# Altium footprint library PcbLib1.PcbLib: 150 footprints (part 4 of 10)
Each footprint in its own frame and in the unit in brackets; x right, y up, seen from the top. Pads: shape width x height; smd on the part's side, far side on the other; paste and mask are expansions set on the pad; w line width, h text height; cw(c..) or ccw(c..) is an arc to the next point about the centre after c.
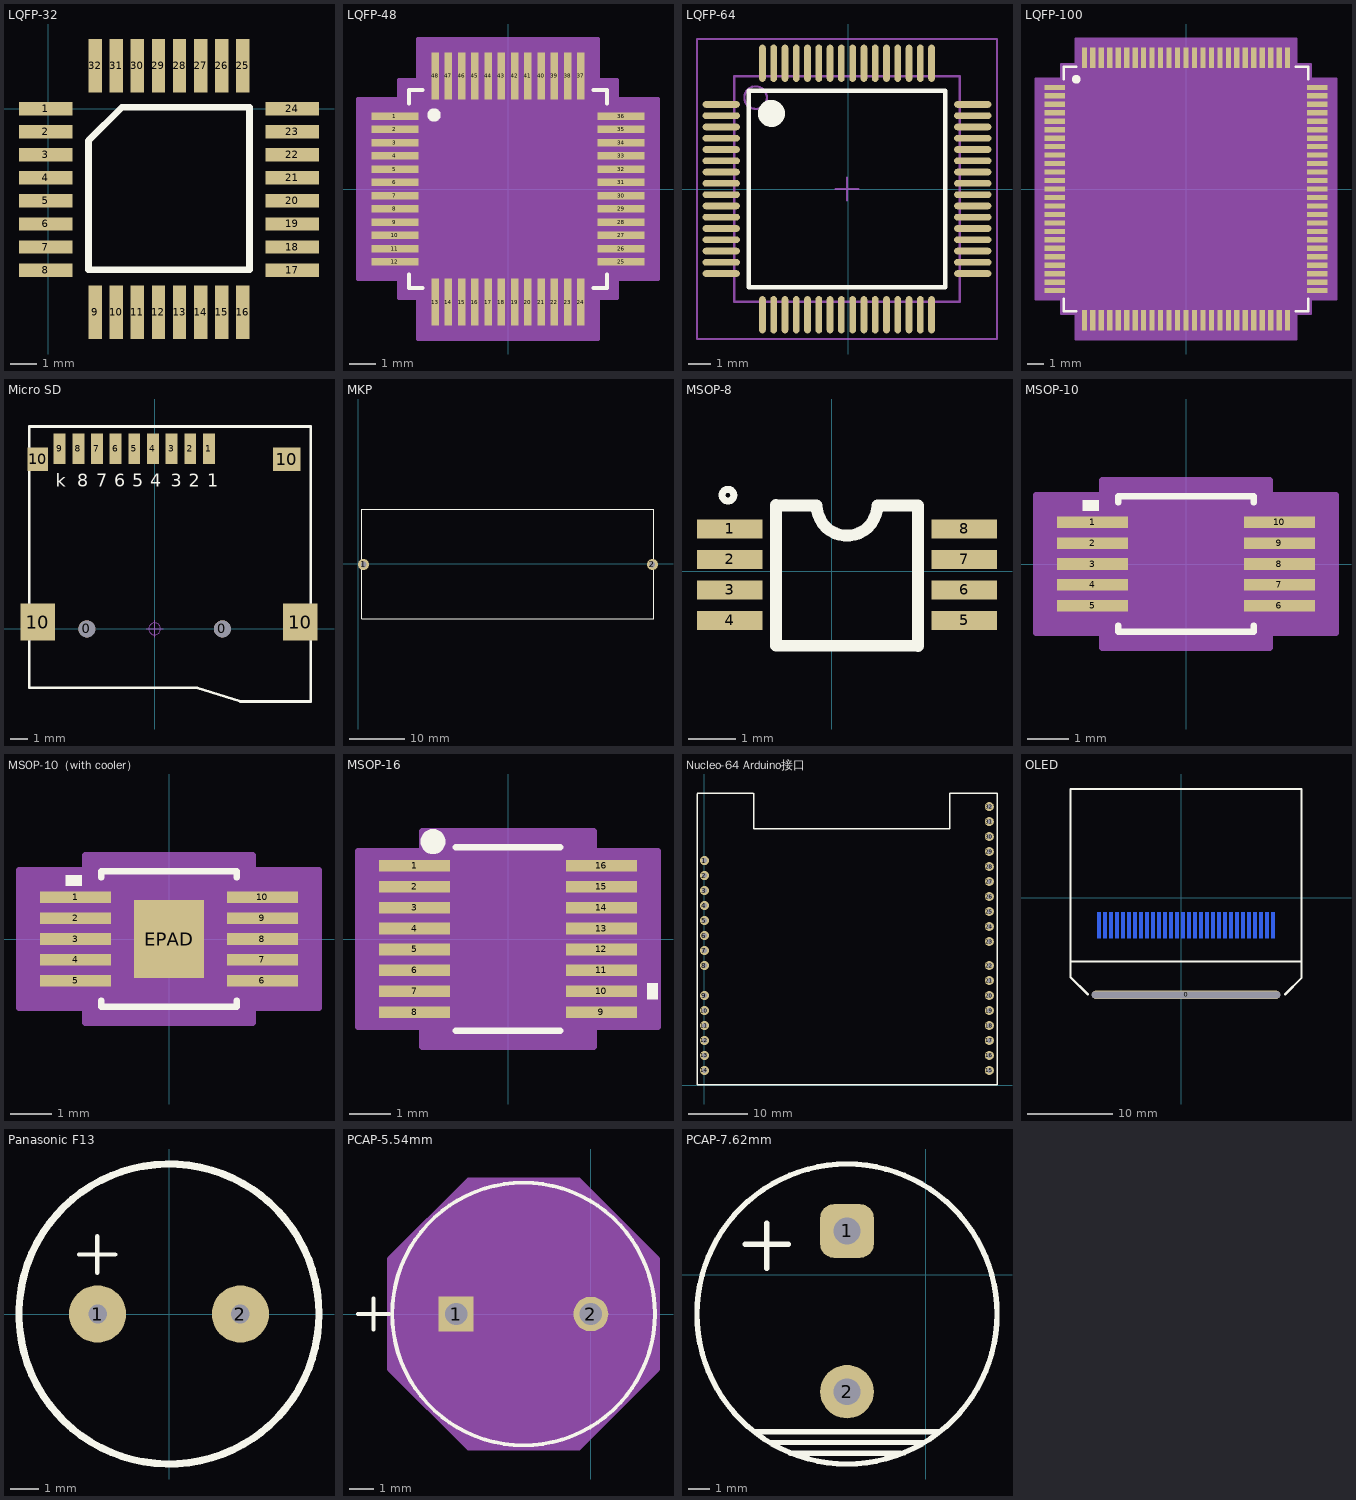
[diagram p3: the footprints below, top view; thin cyan lines are the x and y axes]

## LQFP-32 [mil]
pads (32):
  rect 80x20 smd: 1(-4,0) 2(-4,-34.5) 3(-4,-68.99) 4(-4,-103.49) 5(-4,-137.98) 6(-4,-172.48) 7(-4,-206.98) 8(-4,-241.47) 17(364.47,-241.47) 18(364.47,-206.98) 19(364.47,-172.48) 20(364.47,-137.98) 21(364.47,-103.49) 22(364.47,-68.99) 23(364.47,-34.5) 24(364.47,0)
  rect 20x80 smd: 9(70,-304.47) 10(101.5,-304.47) 11(132.99,-304.47) 12(164.49,-304.47) 13(195.98,-304.47) 14(227.48,-304.47) 15(258.98,-304.47) 16(290.47,-304.47) 25(290.47,64) 26(258.98,64) 27(227.48,64) 28(195.98,64) 29(164.49,64) 30(132.99,64) 31(101.5,64) 32(70,64)
Top Overlay:
  lines w10: 60,-241 60,-48 110,2 300.47,2 300.47,-241 60,-241

## LQFP-48 [mil]
pads (48):
  rect 70x11 smd paste+0 mask+0: 1(-168,108.27) 2(-168,88.58) 3(-168,68.9) 4(-168,49.21) 5(-168,29.53) 6(-168,9.84) 7(-168,-9.84) 8(-168,-29.53) 9(-168,-49.21) 10(-168,-68.9) 11(-168,-88.58) 12(-168,-108.27) 25(168,-108.27) 26(168,-88.58) 27(168,-68.9) 28(168,-49.21) 29(168,-29.53) 30(168,-9.84) 31(168,9.84) 32(168,29.53) 33(168,49.21) 34(168,68.9) 35(168,88.58) 36(168,108.27)
  rect 11x70 smd paste+0 mask+0: 13(-108.27,-168) 14(-88.58,-168) 15(-68.9,-168) 16(-49.21,-168) 17(-29.53,-168) 18(-9.84,-168) 19(9.84,-168) 20(29.53,-168) 21(49.21,-168) 22(68.9,-168) 23(88.58,-168) 24(108.27,-168) 37(108.27,168) 38(88.58,168) 39(68.9,168) 40(49.21,168) 41(29.53,168) 42(9.84,168) 43(-9.84,168) 44(-29.53,168) 45(-49.21,168) 46(-68.9,168) 47(-88.58,168) 48(-108.27,168)
Top Overlay:
  circle w10: c-110,110 r5
  lines w6: -147,-126.87 -147,-147 -126.87,-147 ; -147,126.87 -147,147 -126.87,147 ; 126.87,-147 147,-147 147,-126.87 ; 126.87,147 147,147 147,126.87
Mechanical 15:
  region: -133.77,-162 -162,-162 -162,-133.77 -223,-133.77 -223,133.77 -162,133.77 -162,162 -133.77,162 -133.77,223 133.77,223 133.77,162 162,162 162,133.77 223,133.77 223,-133.77 162,-133.77 162,-162 133.77,-162 133.77,-223 -133.77,-223
  lines w6: -223,-133.77 -223,133.77 -162,133.77 -162,162 -133.77,162 -133.77,223 133.77,223 133.77,162 162,162 162,133.77 223,133.77 223,-133.77 162,-133.77 162,-162 133.77,-162 133.77,-223 -133.77,-223 -133.77,-162 -162,-162 -162,-133.77 -223,-133.77
3D body "LQFP-48-M.stp": height 63.1, standoff 0, extent -181,-181 181,181

## LQFP-64 [mm]
pads (64):
  oval 1.65x0.3 smd: 1(-5.626,3.75) 2(-5.626,3.25) 3(-5.626,2.75) 4(-5.626,2.25) 5(-5.626,1.75) 6(-5.626,1.25) 7(-5.626,0.75) 8(-5.626,0.25) 9(-5.626,-0.25) 10(-5.626,-0.75) 11(-5.626,-1.25) 12(-5.626,-1.75) 13(-5.626,-2.25) 14(-5.626,-2.75) 15(-5.626,-3.25) 16(-5.626,-3.75) 33(5.524,-3.75) 34(5.524,-3.25) 35(5.524,-2.75) 36(5.524,-2.25) 37(5.524,-1.75) 38(5.524,-1.25) 39(5.524,-0.75) 40(5.524,-0.25) 41(5.524,0.25) 42(5.524,0.75) 43(5.524,1.25) 44(5.524,1.75) 45(5.524,2.25) 46(5.524,2.75) 47(5.524,3.25) 48(5.524,3.75)
  oval 0.3x1.65 smd: 17(-3.801,-5.575) 18(-3.301,-5.575) 19(-2.801,-5.575) 20(-2.301,-5.575) 21(-1.801,-5.575) 22(-1.301,-5.575) 23(-0.801,-5.575) 24(-0.301,-5.575) 25(0.199,-5.575) 26(0.699,-5.575) 27(1.199,-5.575) 28(1.699,-5.575) 29(2.199,-5.575) 30(2.699,-5.575) 31(3.199,-5.575) 32(3.699,-5.575) 49(3.699,5.575) 50(3.199,5.575) 51(2.699,5.575) 52(2.199,5.575) 53(1.699,5.575) 54(1.199,5.575) 55(0.699,5.575) 56(0.199,5.575) 57(-0.301,5.575) 58(-0.801,5.575) 59(-1.301,5.575) 60(-1.801,5.575) 61(-2.301,5.575) 62(-2.801,5.575) 63(-3.301,5.575) 64(-3.801,5.575)
Top Overlay:
  circle w0.6: c-3.401,3.35 r0.3
  lines w0.2: -4.401,-4.35 4.299,-4.35 4.299,4.35 -4.401,4.35 -4.401,-4.35
Mechanical 13:
  circle w0.1: c-4.101,4.05 r0.5
  lines w0.1: -5.051,-5 4.949,-5 4.949,5 -5.051,5 -5.051,-5
Mechanical 15:
  lines w0.1: -0.551,0 0.449,0 ; -0.051,-0.5 -0.051,0.5 ; -6.701,-6.65 6.599,-6.65 6.599,6.65 -6.701,6.65 -6.701,-6.65
3D body "LQFP50P1200X1200X160-64.STEP": height 1.59, standoff -0.01, extent -6.151,-6.1 6.049,6.1

## LQFP-100 [mil]
pads (100):
  rect 47x12 smd: 1(-305.12,236.22) 2(-305.12,216.54) 3(-305.12,196.85) 4(-305.12,177.17) 5(-305.12,157.48) 6(-305.12,137.8) 7(-305.12,118.11) 8(-305.12,98.43) 9(-305.12,78.74) 10(-305.12,59.06) 11(-305.12,39.37) 12(-305.12,19.69) 13(-305.12,0) 14(-305.12,-19.68) 15(-305.12,-39.37) 16(-305.12,-59.06) 17(-305.12,-78.74) 18(-305.12,-98.43) 19(-305.12,-118.11) 20(-305.12,-137.8) 21(-305.12,-157.48) 22(-305.12,-177.17) 23(-305.12,-196.85) 24(-305.12,-216.54) 25(-305.12,-236.22) 51(305.12,-236.22) 52(305.12,-216.54) 53(305.12,-196.85) 54(305.12,-177.17) 55(305.12,-157.48) 56(305.12,-137.8) 57(305.12,-118.11) 58(305.12,-98.43) 59(305.12,-78.74) 60(305.12,-59.06) 61(305.12,-39.37) 62(305.12,-19.68) 63(305.12,0) 64(305.12,19.68) 65(305.12,39.37) 66(305.12,59.06) 67(305.12,78.74) 68(305.12,98.43) 69(305.12,118.11) 70(305.12,137.8) 71(305.12,157.48) 72(305.12,177.17) 73(305.12,196.85) 74(305.12,216.54) 75(305.12,236.22)
  rect 12x47 smd: 26(-236.22,-305.12) 27(-216.54,-305.12) 28(-196.85,-305.12) 29(-177.17,-305.12) 30(-157.48,-305.12) 31(-137.8,-305.12) 32(-118.11,-305.12) 33(-98.43,-305.12) 34(-78.74,-305.12) 35(-59.06,-305.12) 36(-39.37,-305.12) 37(-19.68,-305.12) 38(0,-305.12) 39(19.68,-305.12) 40(39.37,-305.12) 41(59.06,-305.12) 42(78.74,-305.12) 43(98.43,-305.12) 44(118.11,-305.12) 45(137.8,-305.12) 46(157.48,-305.12) 47(177.17,-305.12) 48(196.85,-305.12) 49(216.54,-305.12) 50(236.22,-305.12) 76(236.22,305.12) 77(216.54,305.12) 78(196.85,305.12) 79(177.17,305.12) 80(157.48,305.12) 81(137.8,305.12) 82(118.11,305.12) 83(98.43,305.12) 84(78.74,305.12) 85(59.06,305.12) 86(39.37,305.12) 87(19.68,305.12) 88(0,305.12) 89(-19.68,305.12) 90(-39.37,305.12) 91(-59.06,305.12) 92(-78.74,305.12) 93(-98.43,305.12) 94(-118.11,305.12) 95(-137.8,305.12) 96(-157.48,305.12) 97(-177.17,305.12) 98(-196.85,305.12) 99(-216.54,305.12) 100(-236.22,305.12)
Top Overlay:
  circle w10: c-255,255 r5
  lines w6: -284.5,-255.32 -284.5,-284.5 -255.32,-284.5 ; -284.5,255.32 -284.5,284.5 -255.32,284.5 ; 255.32,-284.5 284.5,-284.5 284.5,-255.32 ; 255.32,284.5 284.5,284.5 284.5,255.32
Mechanical 13:
  circle w0: c-256.62,236.22 r3
Mechanical 15:
  region: -256.22,-289.5 -289.5,-289.5 -289.5,-256.22 -348.62,-256.22 -348.62,256.22 -289.5,256.22 -289.5,289.5 -256.22,289.5 -256.22,348.62 256.22,348.62 256.22,289.5 289.5,289.5 289.5,256.22 348.62,256.22 348.62,-256.22 289.5,-256.22 289.5,-289.5 256.22,-289.5 256.22,-348.62 -256.22,-348.62
  lines w6: -348.62,-256.22 -348.62,256.22 -289.5,256.22 -289.5,289.5 -256.22,289.5 -256.22,348.62 256.22,348.62 256.22,289.5 289.5,289.5 289.5,256.22 348.62,256.22 348.62,-256.22 289.5,-256.22 289.5,-289.5 256.22,-289.5 256.22,-348.62 -256.22,-348.62 -256.22,-289.5 -289.5,-289.5 -289.5,-256.22 -348.62,-256.22
Multi-Layer:
  text "Copyright (C) 2016 Accelerated Designs. All rights reserved" at 0,0 h1
3D body "LQFP100-14x14mm.stp": height 63.1, standoff 0, extent -314.84,-314.84 314.84,314.84

## M3过孔 [mm]
via 3.246,1.996 diameter 5.3 hole 3.251
3D body "User Library-M3-A4-socket-cap-screw-din 912.STEP": height 3, standoff -3, extent 0.496,-0.75 5.996,4.75

## Micro SD [mm]
pads (15):
  round 1 hole 1 unplated: 0(-4,0) 0(4,0)
  rect 0.7x1.8 smd: 1(3.2,10.627) 2(2.1,10.627) 3(1,10.627) 4(-0.1,10.627) 5(-1.2,10.627) 6(-2.3,10.627) 7(-3.4,10.627) 8(-4.5,10.627) 9(-5.6,10.627)
  rect 2.032x2.2 smd: 10(-6.9,0.4) 10(8.6,0.4)
  rect 1.2x1.4 smd: 10(-6.9,10)
  rect 1.6x1.4 smd: 10(7.8,10)
Top Overlay:
  lines w0.152: 2.489,-3.47 5.054,-4.283 9.204,-4.283 9.204,11.938 -7.402,11.938 -7.402,-3.47 2.514,-3.47
  text "k" at -5.842,8.382 h0.76
  text "8" at -4.572,8.382 h0.76
  text "7" at -3.455,8.382 h0.76
  text "6" at -2.388,8.382 h0.76
  text "5" at -1.321,8.382 h0.76
  text "4" at -0.254,8.382 h0.76
  text "3" at 0.939,8.382 h0.76
  text "2" at 2.006,8.382 h0.76
  text "1" at 3.098,8.382 h0.76
Mechanical 15:
  circle w0.05: c0,0 r0.35
  lines w0.05: -0.5,0 0.5,0 ; 0,-0.5 0,0.5

## MKP [mm]
pads (2):
  round 2 hole 1: 1(0.94,-0.178) 2(53.238,-0.178)
Top Overlay:
  lines w0.2: 0.635,-1.473 0.635,9.855 53.467,9.855 53.467,-10.033 0.635,-10.033 0.635,0
3D body "电容.STEP": height 20, standoff -15, extent 0.526,-10.058 53.526,9.942

## MSOP-8 [mil]
pads (8):
  rect 55x16 smd: 1(-85.5,35.38) 2(-85.5,9.79) 3(-85.5,-15.79) 4(-85.5,-41.38) 5(111.5,-41.38) 6(111.5,-15.79) 7(111.5,9.79) 8(111.5,35.38)
Top Overlay:
  lines w5.91: -82.08,63.65 cw(c-87,63.7) -82.08,63.76
  lines w10: -46.5,55.2 -12.5,55.2 ccw(c13,55.2) 38.5,55.2 72.5,55.2 72.5,-62.91 ; -46.5,55.31 -46.5,-62.8 71.61,-62.8
3D body "User Library-MSOP8.STEP": height 43, standoff -0.31, extent -84.19,-64.02 110.2,58.03

## MSOP-10 [mil]
pads (10):
  rect 67x11 smd paste+0 mask+0: 1(-88,39.37) 2(-88,19.68) 3(-88,0) 4(-88,-19.68) 5(-88,-39.37) 6(88,-39.37) 7(88,-19.68) 8(88,0) 9(88,19.68) 10(88,39.37)
Top Overlay:
  region: -97.5,50 -97.5,60 -82.5,60 -82.5,50
  lines w6: -64,-57.97 -64,-64 64,-64 64,-57.97 ; -64,57.97 -64,64 64,64 64,57.97
Mechanical 13:
  lines w0: -12,59 ccw(c0,59) 12,59
  lines w1: -99.5,-44.87 -59,-44.87 -59,-33.87 -99.5,-33.87 -99.5,-44.87 ; -99.5,-25.18 -59,-25.18 -59,-14.19 -99.5,-14.19 -99.5,-25.18 ; -99.5,-5.5 -59,-5.5 -59,5.5 -99.5,5.5 -99.5,-5.5 ; -99.5,14.19 -59,14.19 -59,25.18 -99.5,25.18 -99.5,14.19 ; -99.5,33.87 -59,33.87 -59,44.87 -99.5,44.87 -99.5,33.87 ; -59,-59 -59,59 59,59 59,-59 -59,-59 ; 59,-44.87 99.5,-44.87 99.5,-33.87 59,-33.87 59,-44.87 ; 59,-25.18 99.5,-25.18 99.5,-14.19 59,-14.19 59,-25.18 ; 59,-5.5 99.5,-5.5 99.5,5.5 59,5.5 59,-5.5 ; 59,14.19 99.5,14.19 99.5,25.18 59,25.18 59,14.19 ; 59,33.87 99.5,33.87 99.5,44.87 59,44.87 59,33.87
Mechanical 15:
  region: -79,-64.87 -141.5,-64.87 -141.5,64.87 -79,64.87 -79,79 79,79 79,64.87 141.5,64.87 141.5,-64.87 79,-64.87 79,-79 -79,-79
  lines w6: -141.5,-64.87 -79,-64.87 -79,-79 79,-79 79,-64.87 141.5,-64.87 141.5,64.87 79,64.87 79,79 -79,79 -79,64.87 -141.5,64.87 -141.5,-64.87
3D body: height 10, standoff 0, extent 0,0 10,10
3D body "MSE_10-M.stp": height 67.09, standoff 0, extent -99.48,-59.01 99.49,59.02

## MSOP-10（with cooler） [mil]
pads (11):
  rect 67x11 smd paste+0 mask+0: 1(-88,39.37) 2(-88,19.68) 3(-88,0) 4(-88,-19.68) 5(-88,-39.37) 6(88,-39.37) 7(88,-19.68) 8(88,0) 9(88,19.68) 10(88,39.37)
  rect 66x74 smd paste-36.5 mask+0: EPAD(0,0)
Top Overlay:
  region: -97.5,50 -97.5,60 -82.5,60 -82.5,50
  lines w6: -64,-57.97 -64,-64 64,-64 64,-57.97 ; -64,57.97 -64,64 64,64 64,57.97
Top Paste:
  region: 33,37 -33,37 -33,-37 33,-37
Mechanical 13:
  lines w0: -12,59 ccw(c0,59) 12,59
  lines w1: -99.5,-44.87 -59,-44.87 -59,-33.87 -99.5,-33.87 -99.5,-44.87 ; -99.5,-25.18 -59,-25.18 -59,-14.19 -99.5,-14.19 -99.5,-25.18 ; -99.5,-5.5 -59,-5.5 -59,5.5 -99.5,5.5 -99.5,-5.5 ; -99.5,14.19 -59,14.19 -59,25.18 -99.5,25.18 -99.5,14.19 ; -99.5,33.87 -59,33.87 -59,44.87 -99.5,44.87 -99.5,33.87 ; -59,-59 -59,59 59,59 59,-59 -59,-59 ; 59,-44.87 99.5,-44.87 99.5,-33.87 59,-33.87 59,-44.87 ; 59,-25.18 99.5,-25.18 99.5,-14.19 59,-14.19 59,-25.18 ; 59,-5.5 99.5,-5.5 99.5,5.5 59,5.5 59,-5.5 ; 59,14.19 99.5,14.19 99.5,25.18 59,25.18 59,14.19 ; 59,33.87 99.5,33.87 99.5,44.87 59,44.87 59,33.87
Mechanical 15:
  region: -79,-64.87 -141.5,-64.87 -141.5,64.87 -79,64.87 -79,79 79,79 79,64.87 141.5,64.87 141.5,-64.87 79,-64.87 79,-79 -79,-79
  lines w6: -141.5,-64.87 -79,-64.87 -79,-79 79,-79 79,-64.87 141.5,-64.87 141.5,64.87 79,64.87 79,79 -79,79 -79,64.87 -141.5,64.87 -141.5,-64.87
3D body: height 10, standoff 0, extent 0,0 10,10
3D body "MSE_10-M.stp": height 67.09, standoff 0, extent -99.48,-59.01 99.49,59.02

## MSOP-16 [mil]
pads (16):
  rect 67x11 smd: 1(-88,68.95) 2(-88,49.25) 3(-88,29.55) 4(-88,9.85) 5(-88,-9.85) 6(-88,-29.55) 7(-88,-49.25) 8(-88,-68.95) 9(88,-68.95) 10(88,-49.25) 11(88,-29.55) 12(88,-9.85) 13(88,9.85) 14(88,29.55) 15(88,49.25) 16(88,68.95)
Top Overlay:
  region: 131.5,-41.75 141.5,-41.75 141.5,-56.75 131.5,-56.75
  lines w6: -49.36,-86.5 49.36,-86.5 ; -49.36,86.5 49.36,86.5
  lines w11.81: -70.83,97.81 ccw(c-70.78,91.91) -70.73,97.81
Mechanical 13:
  lines w0: -12,81.5 ccw(c0,81.5) 12,81.5
  lines w1: -99.5,-74.45 -99.5,-63.45 -61,-63.45 -61,-74.45 -99.5,-74.45 ; -99.5,-54.75 -99.5,-43.75 -61,-43.75 -61,-54.75 -99.5,-54.75 ; -99.5,-35.05 -99.5,-24.05 -61,-24.05 -61,-35.05 -99.5,-35.05 ; -99.5,-15.35 -99.5,-4.35 -61,-4.35 -61,-15.35 -99.5,-15.35 ; -99.5,4.35 -99.5,15.35 -61,15.35 -61,4.35 -99.5,4.35 ; -99.5,24.05 -99.5,35.05 -61,35.05 -61,24.05 -99.5,24.05 ; -99.5,43.75 -99.5,54.75 -61,54.75 -61,43.75 -99.5,43.75 ; -99.5,63.45 -99.5,74.45 -61,74.45 -61,63.45 -99.5,63.45 ; -61,-81.5 61,-81.5 61,81.5 -61,81.5 -61,-81.5 ; 61,-74.45 61,-63.45 99.5,-63.45 99.5,-74.45 61,-74.45 ; 61,-54.75 61,-43.75 99.5,-43.75 99.5,-54.75 61,-54.75 ; 61,-35.05 61,-24.05 99.5,-24.05 99.5,-35.05 61,-35.05 ; 61,-15.35 61,-4.35 99.5,-4.35 99.5,-15.35 61,-15.35 ; 61,4.35 61,15.35 99.5,15.35 99.5,4.35 61,4.35 ; 61,24.05 61,35.05 99.5,35.05 99.5,24.05 61,24.05 ; 61,43.75 61,54.75 99.5,54.75 99.5,43.75 61,43.75 ; 61,63.45 61,74.45 99.5,74.45 99.5,63.45 61,63.45
Mechanical 15:
  region: -81,-82.8 -141.5,-82.8 -141.5,82.8 -81,82.8 -81,101.5 81,101.5 81,82.8 141.5,82.8 141.5,-82.8 81,-82.8 81,-101.5 -81,-101.5
  lines w6: -141.5,-82.8 -141.5,82.8 -81,82.8 -81,101.5 81,101.5 81,82.8 141.5,82.8 141.5,-82.8 81,-82.8 81,-101.5 -81,-101.5 -81,-82.8 -141.5,-82.8
3D body: height 10, standoff 0, extent 0,0 10,10
3D body "User Library-MSOP-16.STEP": height 37.8, standoff 3.94, extent -96.45,-79.51 96.46,79.5

## Nucleo-64 Arduino接口 [mil]
pads (32):
  round 60 hole 33.46: 1(0,1500) 2(0,1400) 3(0,1300) 4(0,1200) 5(0,1100) 6(0,1000) 7(0,900) 8(0,800) 9(0,600) 10(0,500) 11(0,400) 12(0,300) 13(0,200) 14(0,100) 15(1900,100) 16(1900,200) 17(1900,300) 18(1900,400) 19(1900,500) 20(1900,600) 21(1900,700) 22(1900,800) 23(1900,959.84) 24(1900,1060.2) 25(1900,1160.2) 26(1900,1260.2) 27(1900,1360.2) 28(1900,1460.2) 29(1900,1560.2) 30(1900,1660.2) 31(1900,1760.2) 32(1900,1860.2)
Top Overlay:
  lines w10: -50,1947 -50,6 1951,6 1951,1945 1948,1948 1637.68,1948 1635,1948 1635,1711.77 328,1711.77 328,1948 ; -49,1948 326.22,1948

## OLED [mm]
pads (31):
  oval 22x1 hole 0.762 slot 22 at 0 deg: 0(0.559,-11.352)
  rect 0.4x3 smd far side: 1(-9.591,-3.227) 2(-8.891,-3.227) 3(-8.191,-3.227) 4(-7.491,-3.227) 5(-6.791,-3.227) 6(-6.091,-3.227) 7(-5.391,-3.227) 8(-4.691,-3.227) 9(-3.991,-3.227) 10(-3.291,-3.227) 11(-2.591,-3.227) 12(-1.891,-3.227) 13(-1.191,-3.227) 14(-0.491,-3.227) 15(0.209,-3.227) 16(0.909,-3.227) 17(1.609,-3.227) 18(2.309,-3.227) 19(3.009,-3.227) 20(3.709,-3.227) 21(4.409,-3.227) 22(5.109,-3.227) 23(5.809,-3.227) 24(6.509,-3.227) 25(7.209,-3.227) 26(7.909,-3.227) 27(8.609,-3.227) 28(9.309,-3.227) 29(10.009,-3.227) 30(10.709,-3.227)
Top Overlay:
  lines w0.254: -12.941,-1.377 -12.941,0.123 ; -10.891,-11.327 -12.941,-9.277 -12.941,-7.477 ; 12.109,-11.327 14.059,-9.377 14.059,-7.477 ; -12.941,-7.477 14.059,-7.477 ; -12.941,-7.477 -12.941,12.673 14.059,12.673 14.059,-7.477
Bottom Overlay:
  lines w0.2: -10.391,-7.545 -10.391,-3.397 -10.091,-3.397 -10.091,-5.21 11.209,-5.21 11.209,-3.397 11.509,-3.397 11.509,-7.449 8.561,-10.397 6.461,-10.397 -5.439,-10.397 -7.539,-10.397 -10.391,-7.545
3D body "User Library-096OLED.step": height 2.62, standoff -1.22, extent -12.867,-11.572 13.833,10.645

## Panasonic F13 [mm]
pads (2):
  round 2 hole 0.65: 1(-2.5,0) 2(2.5,0)
Top Overlay:
  circle w0.254: c0,0 r5.25
  lines w0.152: -3.15,2.083 -1.88,2.083 ; -2.515,1.448 -2.515,2.718
Mechanical 13:
  lines w0.025: -3.15,2.083 -1.88,2.083 ; -2.515,1.448 -2.515,2.718
3D body "西内！.STEP": height 13, standoff -4.8, extent -5,-5 5,5

## PCAP-5.54mm [mil]
pads (2):
  rect 56x56 hole 36 mask+0: 1(-217,0)
  round 56 hole 36 mask+0: 2(0,0)
Top Overlay:
  circle w6: c-108.5,0 r211.5
  lines w6: -375,0 -325,0 ; -350,-25 -350,25
Mechanical 13:
  circle w0: c-108.5,0 r206.5
  lines w1: -375,0 -325,0 ; -350,-25 -350,25
Mechanical 15:
  region: -325,89.15 -197.65,216.5 -19.35,216.5 108,89.15 108,-89.15 -19.35,-216.5 -197.65,-216.5 -325,-89.15
  lines w6: -325,-89.15 -325,89.15 -197.65,216.5 -19.35,216.5 108,89.15 108,-89.15 -19.35,-216.5 -197.65,-216.5 -325,-89.15
3D body: height 10, standoff 0, extent 0,0 10,10
3D body "PCAP_SEP_F13.stp": height 512.99, standoff -177.99, extent -319.02,-212.99 95,200

## PCAP-7.62mm [mil]
pads (2):
  rrect50% 100x100 hole 50: 1(-147,82)
  round 100 hole 50: 2(-147,-218)
Top Overlay:
  circle w10: c-147,-73 r280.04
  lines w10: -337,57 -257,57 ; -317,-293 23,-293 ; -297,12 -297,97 ; -287,-313 -7,-313 ; -252,-333 -47,-333